# Altium footprint library lib_protel_HC.PCBLIB: 724 footprints (part 9 of 46)
Each footprint in its own frame and in the unit in brackets; x right, y up, seen from the top. Pads: shape width x height; smd on the part's side, far side on the other; paste and mask are expansions set on the pad; w line width, h text height; cw(c..) or ccw(c..) is an arc to the next point about the centre after c.
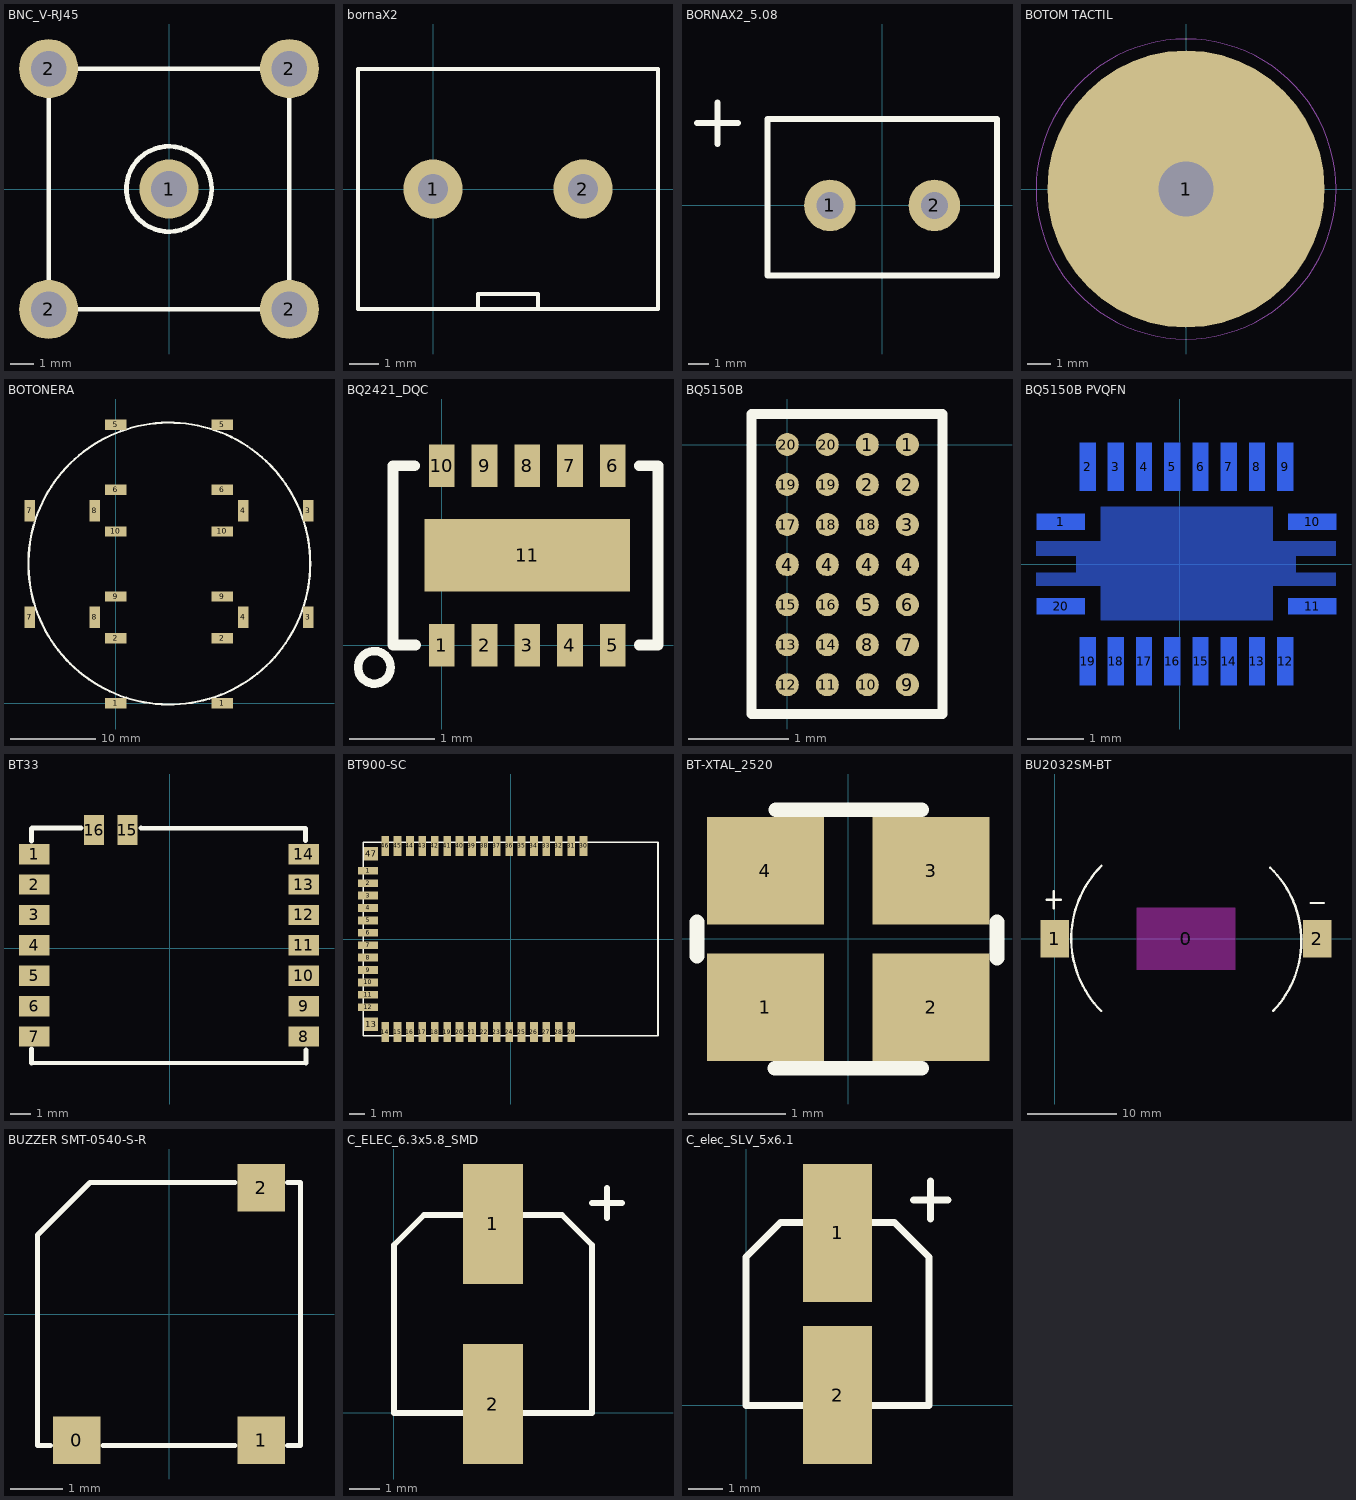
[diagram p8: the footprints below, top view; thin cyan lines are the x and y axes]

## BNC_V-RJ45 [mm]
pads (5):
  round 2.5 hole 1.5: 1(0,0) 2(-5.08,-5.08) 2(-5.08,5.08) 2(5.08,-5.08) 2(5.08,5.08)
Top Overlay:
  circle w0.2: c0,0 r1.8
  lines w0.2: -5.08,-3.81 -5.08,3.81 ; -3.81,-5.08 3.81,-5.08 ; -3.81,5.08 3.81,5.08 ; 5.08,-3.81 5.08,3.81
Mechanical 1:
  circle w0.025: c0,0 r0.2
  circle w0.025: c0,0 r1.05
  circle w0.025: c0,0 r1.8

## bornaX2 [mm] "paso 5.08"
pads (2):
  round 2 hole 1: 1(0,0) 2(5.08,0)
Top Overlay:
  lines w0.127: 1.524,-4.064 1.524,-3.556 3.556,-3.556 3.556,-4.064 ; -2.54,-4.064 -2.54,4.064 7.62,4.064 7.62,-4.064 -2.54,-4.064

## BORNAX2_5.08 [mm] "On Shore OSTTC022162"
height 10
pads (2):
  round 2.5 hole 1.3: 1(-2.54,0) 2(2.54,0)
Top Overlay:
  lines w0.3: -9,4 -7,4 ; -8,3 -8,5 ; -5.58,-3.4 5.58,-3.4 5.58,4.2 -5.58,4.2 -5.58,-3.4

## BOTOM TACTIL [mm] "BOTON PARA SISTEMA TACTIL CAPACITIVO."
pads (1):
  round 12 / inner round 0 / far side round 0 hole 2.4 mask+0.1: 1(0,0)
Mechanical 1:
  circle w0.051: c0,0 r6.5

## BOTONERA [mm] "MEC"
height 10
pads (20):
  rect 2.5x1.2 smd: 1(0,0) 1(12.5,0) 2(0,7.62) 2(12.5,7.62) 5(0,32.62) 5(12.5,32.62) 6(0,25) 6(12.5,25) 9(0,12.5) 9(12.5,12.5) 10(0,20.12) 10(12.5,20.12)
  rect 1.2x2.5 smd: 3(22.56,10.06) 3(22.56,22.56) 4(14.94,10.06) 4(14.94,22.56) 7(-10.06,10.06) 7(-10.06,22.56) 8(-2.44,10.06) 8(-2.44,22.56)
Top Overlay:
  circle w0.254: c6.29,16.36 r16.5

## BQ2421_DQC [mm] "BQ2421_DQC"
height 0.8
pads (11):
  rect 0.3x0.5 smd: 1(0,0) 2(0.5,0) 3(1,0) 4(1.5,0) 5(2,0) 6(2,2.1) 7(1.5,2.1) 8(1,2.1) 9(0.5,2.1) 10(0,2.1)
  rect 2.4x0.85 smd: 11(1,1.05)
Top Overlay:
  circle w0.1: c-0.79,-0.26 r0.191
  lines w0.127: -0.32,2.1 -0.57,2.1 -0.57,0 -0.31,0 ; 2.31,0 2.53,0 2.53,2.1 2.31,2.1

## BQ5150B [mm] "BqTesla Cargador Inductivo con carga de baterías"
height 0.5
pads (28):
  round 0.23 smd mask+0.05: 1(0.8,0) 1(1.2,0) 2(0.8,-0.4) 2(1.2,-0.4) 3(1.2,-0.8) 4(0,-1.2) 4(0.4,-1.2) 4(0.8,-1.2) 4(1.2,-1.2) 5(0.8,-1.6) 6(1.2,-1.6) 7(1.2,-2) 8(0.8,-2) 9(1.2,-2.4) 10(0.8,-2.4) 11(0.4,-2.4) 12(0,-2.4) 13(0,-2) 14(0.4,-2) 15(0,-1.6) 16(0.4,-1.6) 17(0,-0.8) 18(0.4,-0.8) 18(0.8,-0.8) 19(0,-0.4) 19(0.4,-0.4) 20(0,0) 20(0.4,0)
Top Overlay:
  lines w0.1: 1.524,0.305 -0.356,0.305 -0.356,-2.692 1.549,-2.692 ; 1.549,-2.667 1.549,0.305

## BQ5150B PVQFN [mm] "BQ51051B"
height 1
pads (20):
  rect 0.85x0.28 smd far side mask+0.07: 1(-2.107,0.752) 10(2.343,0.752) 11(2.343,-0.748) 20(-2.107,-0.748)
  rect 0.28x0.85 smd far side mask+0.07: 2(-1.632,1.727) 3(-1.132,1.727) 4(-0.632,1.727) 5(-0.132,1.727) 6(0.368,1.727) 7(0.868,1.727) 8(1.368,1.727) 9(1.868,1.727) 12(1.868,-1.723) 13(1.368,-1.723) 14(0.868,-1.723) 15(0.368,-1.723) 16(-0.132,-1.723) 17(-0.632,-1.723) 18(-1.132,-1.723) 19(-1.632,-1.723)
Bottom Layer:
  region: -1.403,-0.991 -1.403,-0.381 -2.546,-0.381 -2.546,-0.152 -1.835,-0.152 -1.835,0.152 -2.546,0.152 -2.546,0.406 -1.403,0.406 -1.403,1.016 1.645,1.016 1.645,0.406 2.762,0.406 2.762,0.152 2.051,0.152 2.051,-0.152 2.762,-0.152 2.762,-0.381 1.645,-0.381 1.645,-0.991
Bottom Overlay:
  circle w0.254: c-2.125,1.425 r0.071
  lines w0.1: -2.14,-1.829 -1.911,-1.829 ; -2.14,-1.778 -2.14,-1.041 ; -2.14,1.041 -2.14,1.727 -1.911,1.727 ; 2.127,-1.829 2.356,-1.829 2.356,-1.016 ; 2.127,1.727 2.356,1.727 2.356,1.016

## BT33 [mm] "Modulo Bluetooth 3.0"
height 2.3
pads (16):
  rect 1.5x1 smd: 1(-6.675,4.635) 2(-6.675,3.135) 3(-6.675,1.635) 4(-6.675,0.135) 5(-6.675,-1.365) 6(-6.675,-2.865) 7(-6.675,-4.365) 8(6.625,-4.365) 9(6.625,-2.865) 10(6.625,-1.365) 11(6.625,0.135) 12(6.625,1.635) 13(6.625,3.135) 14(6.625,4.635)
  rect 1x1.5 smd: 15(-2.075,5.825) 16(-3.725,5.825)
Top Overlay:
  lines w0.2: -6.8,-5.675 6.725,-5.675
  lines w0.25: -6.8,-5.675 -6.8,-4.975 ; -6.8,5.275 -6.8,5.9 ; -6.775,5.925 -4.375,5.925 ; -1.4,5.925 6.7,5.9 6.7,5.3 ; 6.724,-5.025 6.725,-5.675

## BT900-SC [mm] "modulo bluetooth 4.0 antena externa"
height 2.4
pads (47):
  rect 1.3x0.5 smd: 1(-9.2,4.4) 2(-9.2,3.6) 3(-9.2,2.8) 4(-9.2,2) 5(-9.2,1.2) 6(-9.2,0.4) 7(-9.2,-0.4) 8(-9.2,-1.2) 9(-9.2,-2) 10(-9.2,-2.8) 11(-9.2,-3.6) 12(-9.2,-4.4)
  rect 0.9x0.9 smd: 13(-9,-5.5) 47(-9,5.5)
  rect 0.5x1.3 smd: 14(-8.1,-6) 15(-7.3,-6) 16(-6.5,-6) 17(-5.7,-6) 18(-4.9,-6) 19(-4.1,-6) 20(-3.3,-6) 21(-2.5,-6) 22(-1.7,-6) 23(-0.9,-6) 24(-0.1,-6) 25(0.7,-6) 26(1.5,-6) 27(2.3,-6) 28(3.1,-6) 29(3.9,-6) 30(4.7,6) 31(3.9,6) 32(3.1,6) 33(2.3,6) 34(1.5,6) 35(0.7,6) 36(-0.1,6) 37(-0.9,6) 38(-1.7,6) 39(-2.5,6) 40(-3.3,6) 41(-4.1,6) 42(-4.9,6) 43(-5.7,6) 44(-6.5,6) 45(-7.3,6) 46(-8.1,6)
Top Overlay:
  lines w0.1: -9.5,-6.25 9.5,-6.25 9.5,6.25 -9.5,6.25 -9.5,-6.25
3D body "BT900 SC.STEP": height 2.28, standoff 0, extent -9.45,-6.25 9.55,6.25

## BT-XTAL_2520 [mm]
pads (4):
  rect 1.2x1.1 smd: 1(-0.85,-0.7) 2(0.85,-0.7) 3(0.85,0.7) 4(-0.85,0.7)
Top Overlay:
  lines w0.152: -1.55,-0.175 -1.55,0.175 ; -0.75,-1.325 0.75,-1.325 ; -0.74,1.325 0.75,1.325 ; 1.525,-0.195 1.525,0.175
3D body "User Library-GeyerElectronics_KX6.step": height 0.56, standoff 0, extent -1.25,-1 1.27,1

## BU2032SM-BT [mm] "BATTERY HOLDER CR2032"
height 5.2
pads (3):
  rect 11x7 on Keep-Out: 0(14.65,0)
  rect 3.2x4.2 smd: 1(0,0) 2(29.3,0)
Top Overlay:
  lines w0.254: -0.9,4.35 0.675,4.35 ; -0.125,3.4 -0.125,5.3 ; 5.175,-8.075 cw(c13.313,0.012) 5.225,8.15 ; 24.05,7.925 cw(c16.212,-0.238) 24.375,-8.075 ; 28.55,3.975 30.05,3.975

## BUZZER SMT-0540-S-R [mm] "BUZZER SMT-0540-S-R"
height 2.1
pads (3):
  rect 0.9x0.9 smd: 0(-1.75,-2.4) 1(1.75,-2.4) 2(1.75,2.4)
Top Overlay:
  lines w0.1: -2.25,-2.5 -2.5,-2.5 -2.5,-1.75 -2.5,1.5 -1.5,2.5 0,2.5 1.25,2.5 ; -0.25,-2.5 -1.25,-2.5 1.25,-2.5 ; 2.25,-2.5 2.5,-2.5 2.5,0 2.5,2.5 2.25,2.5
3D body "SMT-0540-S-R.STEP": height 2, standoff 0, extent -2.35,-2.75 2.65,2.65

## C_ELEC_6.3x5.8_SMD [mm] "C_ELEC_6.3x5.8_SMD"
height 5.8
pads (2):
  rect 2x4 smd: 1(3.3,6.3) 2(3.3,0.3)
Top Overlay:
  lines w0.203: 6.6,7 7.6,7 ; 7.1,6.5 7.1,7.5 ; 0,0 0,5.6 1,6.6 5.6,6.6 6.6,5.6 6.6,0 0,0

## C_elec_SLV_5x6.1 [mm] "C_elec_SLV_5x6.1"
height 6.1
pads (2):
  rect 2x4 smd: 1(2.65,5) 2(2.65,0.3)
Top Overlay:
  lines w0.203: 4.85,5.95 5.85,5.95 ; 5.35,5.4 5.35,6.5 ; 0,0 0,4.3 1,5.3 4.3,5.3 5.3,4.3 5.3,0 0,0

## Camara OV2643 [mm]
height 5.71
3D body "Camera.STEP": height 5.7, standoff 0, extent -4,-4 4,4
3D body "Camera_GodI.STEP": height 0, standoff 0, extent -2540,-2521 -2540,-2521
3D body "Camera_GodI.STEP": height 0, standoff 0, extent -1271.5,-1251.5 -1271.5,-1251.5